# Altium footprint library 常用原件库.PcbLib: 163 footprints (part 2 of 11)
Each footprint in its own frame and in the unit in brackets; x right, y up, seen from the top. Pads: shape width x height; smd on the part's side, far side on the other; paste and mask are expansions set on the pad; w line width, h text height; cw(c..) or ccw(c..) is an arc to the next point about the centre after c.
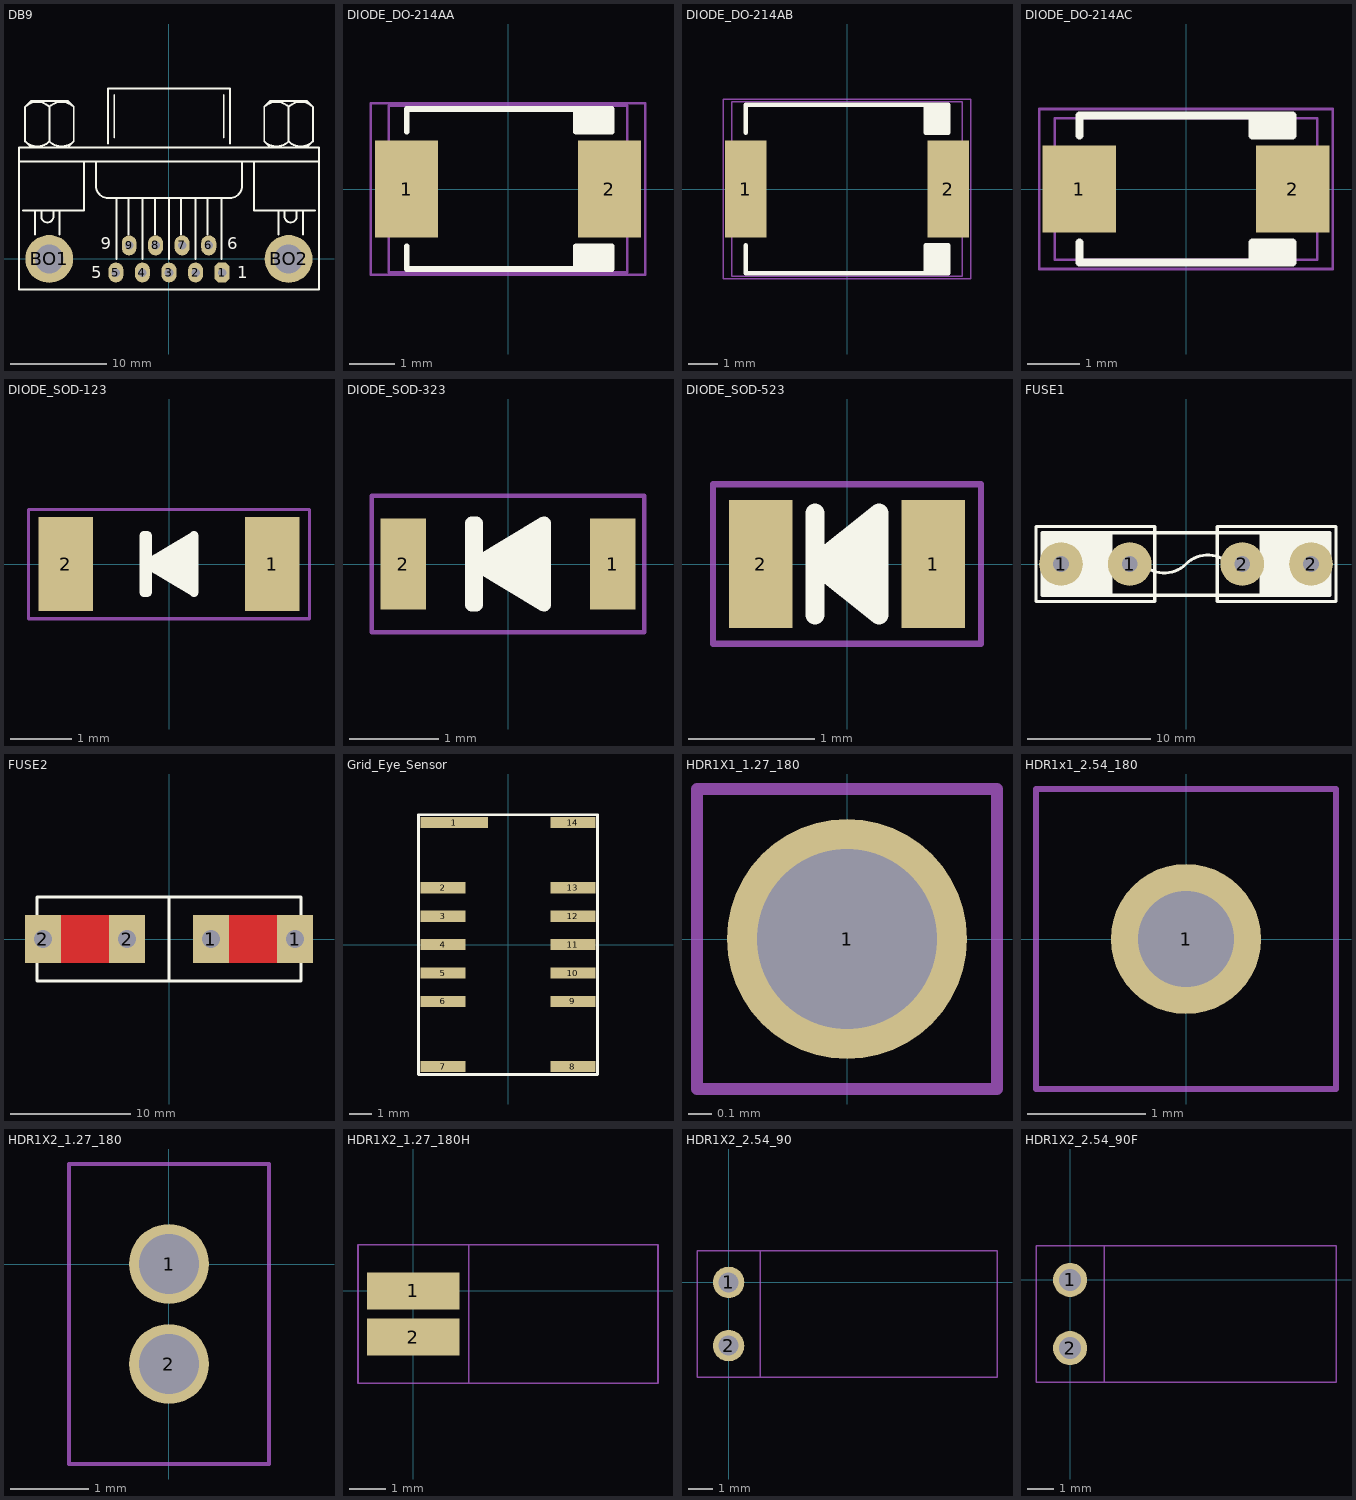
[diagram p1: the footprints below, top view; thin cyan lines are the x and y axes]

## DB9 [mil] "DB9"
pads (11):
  oct 62x82 hole 35: 1(218.75,-55.83)
  oval 62x82 hole 35: 2(109.58,-55.83) 3(0.42,-55.83) 4(-108.75,-55.83) 5(-217.92,-55.83) 6(163.75,55.83) 7(54.58,55.83) 8(-54.58,55.83)
  oval 60x82 hole 35: 9(-163.75,55.83)
  round 196.67 hole 118.33: BO1(-492.08,0) BO2(492.08,0)
Top Overlay:
  lines w8: -616.25,400 617.08,400 ; -599.58,200 -349.58,200 -349.58,400 ; -591.34,483.25 ccw(c-541.25,533.33) -491.16,483.25 ; -591.34,625.09 cw(c-541.25,575) -491.16,625.09 ; -566.25,458.33 -591.25,483.33 -591.25,625 -566.25,650 -416.25,650 -391.25,625 -391.25,483.33 -416.25,458.33 ; -549.58,100 -549.58,200 ; -524.58,200 -524.58,175 ccw(c-499.58,175) -474.58,175 -474.58,200 ; -491.34,483.25 ccw(c-441.25,533.33) -391.16,483.25 ; -491.34,625.09 cw(c-441.25,575) -391.16,625.09 ; -491.25,483.33 -491.25,625 ; -449.58,100 -449.58,200 ; -299.58,400 -299.58,300 ccw(c-249.58,300) -249.58,250 250.42,250 ccw(c250.42,300) 300.42,300 300.42,400 ; -249.58,475 -249.58,700 250.42,700 250.42,475 ; -224.58,500 -224.58,675 ; -216.25,0 -216.25,250 ; -166.25,100 -166.25,250 ; -107.92,0 -107.92,250 ; -57.92,100 -57.92,250 ; 0.42,0 0.42,250 ; 50.42,100 50.42,250 ; 108.75,0 108.75,250 ; 158.75,100 158.75,250 ; 217.08,0 217.08,250 ; 225.42,500 225.42,675 ; 350.42,400 350.42,200 600.42,200 ; 392,483.25 ccw(c442.08,533.33) 492.17,483.25 ; 392,625.09 cw(c442.08,575) 492.17,625.09 ; 417.08,458.33 392.08,483.33 392.08,625 417.08,650 567.08,650 592.08,625 592.08,483.33 567.08,458.33 ; 450.42,100 450.42,200 ; 475.42,200 475.42,175 ccw(c500.42,175) 525.42,175 525.42,200 ; 492,483.25 ccw(c542.08,533.33) 592.17,483.25 ; 492,625.09 cw(c542.08,575) 592.17,625.09 ; 492.08,483.33 492.08,625 ; 550.42,100 550.42,200 ; -616.25,-125 617.08,-125 617.08,458.33 -616.25,458.33 -616.25,-125
  text "6" at 240.42,40 h50
  text "1" at 280.42,-80 h50
  text "5" at -319.58,-80 h50
  text "9" at -279.58,40 h50

## DIODE_DO-214AA [mil] "SMB"
height 104.33
pads (2):
  rect 55x85 smd: 1(-88.58,0) 2(88.58,0)
Top Overlay:
  region: 59.5,50 59.5,70 90.58,70 90.58,50
  region: 59.5,-50 59.5,-70 90.58,-70 90.58,-50
  lines w5: -88.58,-50 -88.58,-70 90.58,-70 90.58,-50 59.5,-50 59.5,-70 ; -88.58,50 -88.58,70 90.58,70 90.58,50 59.5,50 59.5,70
Mechanical 13:
  lines w2: -104.33,-72.84 -104.33,72.84 104.33,72.84 104.33,-72.84 -104.33,-72.84
Mechanical 14:
  lines w2: -120,-75 120,-75 120,75 -120,75 -120,-75
3D body: height 86.65, standoff -1.97, extent -104.33,-72.84 104.33,72.84

## DIODE_DO-214AB [mil] "SMC"
height 98.43
pads (2):
  rect 55x130 smd: 1(-135,0) 2(135,0)
Top Overlay:
  rectangle: 105,74.8 135,112.05
  rectangle: 105,-112.05 135,-74.8
  lines w6: -135,-75 -135,-112.05 135,-112.05 135,-74.8 105,-74.8 105,-112.05 ; -135,74.8 -135,112.05 135,112.05 135,74.8 105,74.8 105,112.05
Mechanical 13:
  lines w2: -153.54,-116.14 -153.54,116.14 153.54,116.14 153.54,-116.14 -153.54,-116.14
Mechanical 14:
  lines w2: -165,-120 165,-120 165,120 -165,120 -165,-120
3D body: height 94.53, standoff -1.97, extent -153.54,-116.14 153.54,116.14

## DIODE_DO-214AC [mil] "SMA"
pads (2):
  rect 55x65 smd: 1(-80,0) 2(80,0)
Top Overlay:
  region: 50,40 50,55 80,55 80,40
  region: 50,-40 50,-55 80,-55 80,-40
  lines w6: -80,-40 -80,-55 80,-55 80,-40 50,-40 50,-55 ; -80,40 -80,55 80,55 80,40 50,40 50,55
Mechanical 13:
  lines w2: -98.44,-53.16 98.41,-53.16 98.41,53.14 -98.44,53.14 -98.44,-53.16
Mechanical 14:
  lines w2: -110,-60 -110,60 110,60 110,-60 -110,-60
3D body: height 84.69, standoff -1.97, extent -98.44,-53.16 98.41,53.14

## DIODE_SOD-123 [mil]
height 45.28
pads (2):
  rrect0% 35x60 smd: 1(66,0) 2(-66,0)
Top Overlay:
  region: 16,18 16,-18 -14,0
  lines w6: -16,-18 -14,-18 -14,18 -16,18 -16,-18 ; -14,0 16,18 16,-18 -14,0
Mechanical 14:
  lines w2: -90,-35 -90,35 90,35 90,-35 -90,-35
3D body: height 46.46, standoff 0, extent -76.77,-35.43 76.78,35.43

## DIODE_SOD-323 [mil]
height 45.28
pads (2):
  rrect0% 20x40 smd: 1(46,0) 2(-46,0)
Top Overlay:
  region: 16,18 16,-18 -14,0
  lines w6: -16,-18 -16,18 -14,18 -14,-18 -16,-18 ; -14,0 16,-18 16,18 -14,0
Mechanical 14:
  lines w2: -60,-30 60,-30 60,30 -60,30 -60,-30
3D body: height 43.31, standoff 0, extent -51.18,-26.58 51.18,26.58

## DIODE_SOD-523 [mil]
height 45.28
pads (2):
  rrect0% 20x40 smd: 1(27,0) 2(-27,0)
Top Overlay:
  region: 10,-16 10,16 -10,0
  lines w6: -10,-16 -10,16 ; -10,0 10,-16 10,16 -10,0
Mechanical 14:
  lines w2: -42,-25 -42,25 42,25 42,-25 -42,-25
3D body: height 27.56, standoff 0, extent -31.5,-15.7 31.5,15.7

## FUSE1 [mil]
pads (4):
  round 140 hole 50: 1(-400,0) 1(-180,0) 2(180,0) 2(400,0)
Top Overlay:
  rectangle: -460,-100 -240,100
  rectangle: 240,-100 460,100
  lines w10: -240,-100 -240,100 ; -140,0 ccw(c-70,70) 0,0 cw(c70,-70) 140,0 ; 240,-100 240,100 ; -480,-120 -480,0 -480,120 -100,120 -100,-120 -480,-120 ; -460,-100 460,-100 460,100 440,100 -460,100 -460,-100 ; 100,-120 100,120 480,120 480,-120 100,-120

## FUSE2 [mil]
pads (4):
  rect 118x157 hole 59: 1(137.5,0) 1(413.5,0) 2(-413.5,0) 2(-137.5,0)
Top Layer:
  rectangle: 177.5,-79 374.5,79
  rectangle: -373.5,-79 -177.5,79
Bottom Layer:
  rectangle: -373.5,-79 -177.5,79
  rectangle: 177.5,-79 374.5,79
Top Overlay:
  lines w10: 0.5,-138 0.5,138 ; -432.5,-138 -432.5,138 433.5,138 433.5,-138 -432.5,-138

## Grid_Eye_Sensor [mm] "Grid Eye Sensor"
pads (14):
  rect 3x0.5 smd: 1(-2.4,5.45)
  rect 2x0.5 smd: 2(-2.9,2.54) 3(-2.9,1.27) 4(-2.9,0) 5(-2.9,-1.27) 6(-2.9,-2.54) 7(-2.9,-5.45) 8(2.9,-5.45) 9(2.9,-2.54) 10(2.9,-1.27) 11(2.9,0) 12(2.9,1.27) 13(2.9,2.54) 14(2.9,5.45)
Top Overlay:
  lines w0.127: -4,-5.8 4,-5.8 4,5.8 -4,5.8 -4,-5.8
Bottom Paste:
  lines w0.027: -3.9,-5.8 -3.9,5.8 ; 3.9,-5.8 3.9,5.8

## HDR1X1_1.27_180 [mil]
height 169.29
pads (1):
  round 40 hole 30: 1(0,0)
Mechanical 13:
  lines w2: -25,-25 25,-25 25,25 -25,25 -25,-25
Mechanical 14:
  lines w2: -25,-25 -25,25 25,25 25,-25 -25,-25

## HDR1x1_2.54_180 [mil]
height 169.29
pads (1):
  round 50 hole 32: 1(0,0)
Mechanical 13:
  lines w2: -50,-50 -50,50 50,50 50,-50 -50,-50
Mechanical 14:
  lines w2: -50,-50 -50,50 50,50 50,-50 -50,-50

## HDR1X2_1.27_180 [mil]
height 169.29
pads (2):
  round 40 hole 30: 1(0,0) 2(0,-50)
Mechanical 13:
  lines w2: -50,-100 50,-100 50,50 -50,50 -50,-100
Mechanical 14:
  lines w2: -50,-100 50,-100 50,50 -50,50 -50,-100
3D body: height 210.24, standoff -102.36, extent -49.21,-74.99 49.21,25.01

## HDR1X2_1.27_180H [mil]
height 169.29
pads (2):
  rect 100x40 smd: 1(0,0) 2(0,-50)
Mechanical 13:
  lines w2: -60,-100 -60,50 265,50 265,-100 -60,-100
Mechanical 14:
  lines w2: -60,-100 -60,50 60,50 60,-100 -60,-100
3D body: height 49.21, standoff -49.21, extent -47.36,-74.99 265.24,25.01

## HDR1X2_2.54_90 [mil]
height 169.29
pads (2):
  round 50 hole 32: 1(0,0) 2(0,-100)
Mechanical 13:
  lines w2: -50,-150 -50,50 425,50 425,-150 -50,-150
Mechanical 14:
  lines w2: -50,-150 50,-150 50,50 -50,50 -50,-150
3D body: height 99.21, standoff -93.7, extent -15,-146.06 423.58,46.06

## HDR1X2_2.54_90F [mil]
height 169.29
pads (2):
  round 50 hole 32: 1(0,0) 2(0,-100)
Mechanical 13:
  lines w2: -50,-150 -50,50 390,50 390,-150 -50,-150
Mechanical 14:
  lines w2: -50,-150 -50,50 50,50 50,-150 -50,-150
3D body: height 99.21, standoff -125.2, extent -10,-154.92 386.06,54.92